# Altium footprint library common.PcbLib: 552 footprints (part 19 of 35)
Each footprint in its own frame and in the unit in brackets; x right, y up, seen from the top. Pads: shape width x height; smd on the part's side, far side on the other; paste and mask are expansions set on the pad; w line width, h text height; cw(c..) or ccw(c..) is an arc to the next point about the centre after c.
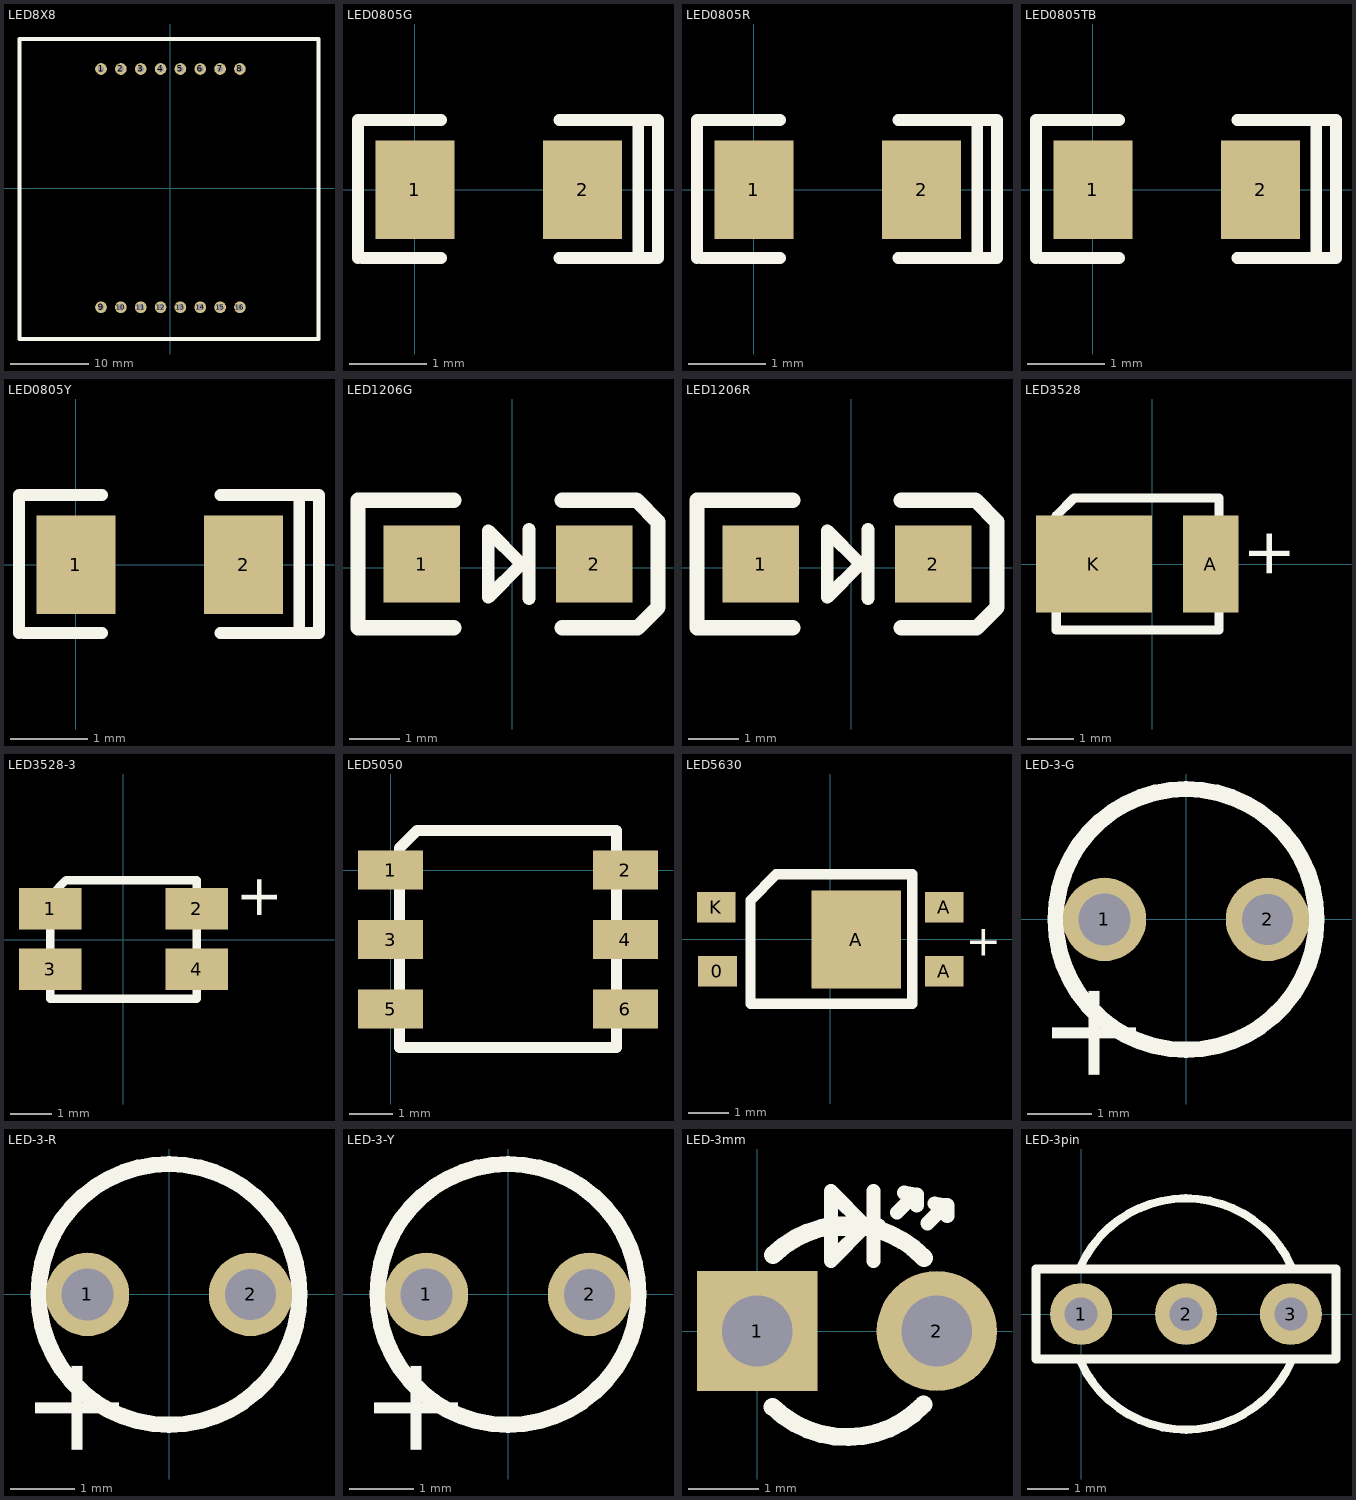
[diagram p18: the footprints below, top view; thin cyan lines are the x and y axes]

## LED8X8 [mm]
pads (16):
  round 1.5 hole 0.8: 1(-8.89,15.253) 2(-6.35,15.253) 3(-3.81,15.253) 4(-1.27,15.253) 5(1.27,15.253) 6(3.81,15.253) 7(6.35,15.253) 8(8.89,15.253) 9(-8.89,-15.253) 10(-6.35,-15.253) 11(-3.81,-15.253) 12(-1.27,-15.253) 13(1.27,-15.253) 14(3.81,-15.253) 15(6.35,-15.253) 16(8.89,-15.253)
Top Overlay:
  lines w0.508: -19.355,-19.317 -19.355,19.088 18.974,19.088 18.974,-19.317 -19.355,-19.317
3D body: height 10.4, standoff -4, extent -19.3,-19.313 19,18.987

## LED0805G [mil]
pads (2):
  rect 40x50 smd: 1(0,0) 2(85,0)
Top Overlay:
  lines w5.98: 113.15,-34.61 123.15,-34.61 ; 113.15,35.39 123.15,35.39
  lines w6: -28.86,-34.61 -28.86,35.39 13.15,35.39 ; -26.85,-34.61 13.15,-34.61 ; 73.15,-34.61 113.15,-34.61 113.15,35.39 73.15,35.39 ; 123.15,-34.61 123.15,35.39
3D body: height 43.31, standoff 0, extent 3.39,-24.21 82.91,25

## LED0805R [mil]
pads (2):
  rect 40x50 smd: 1(0,0) 2(85,0)
Top Overlay:
  lines w5.98: 113.15,-34.61 123.15,-34.61 ; 113.15,35.39 123.15,35.39
  lines w6: -28.86,-34.61 -28.86,35.39 13.15,35.39 ; -26.85,-34.61 13.15,-34.61 ; 73.15,-34.61 113.15,-34.61 113.15,35.39 73.15,35.39 ; 123.15,-34.61 123.15,35.39
3D body: height 43.31, standoff 0, extent 3.39,-24.21 82.91,25

## LED0805TB [mil]
pads (2):
  rect 40x50 smd: 1(0,0) 2(85,0)
Top Overlay:
  lines w5.98: 113.15,-34.61 123.15,-34.61 ; 113.15,35.39 123.15,35.39
  lines w6: -28.86,-34.61 -28.86,35.39 13.15,35.39 ; -26.85,-34.61 13.15,-34.61 ; 73.15,-34.61 113.15,-34.61 113.15,35.39 73.15,35.39 ; 123.15,-34.61 123.15,35.39
3D body: height 33.45, standoff 0.23, extent -2.07,-17.71 79.13,17.97

## LED0805Y [mil]
pads (2):
  rect 40x50 smd: 1(0,0) 2(85,0)
Top Overlay:
  lines w5.98: 113.15,-34.61 123.15,-34.61 ; 113.15,35.39 123.15,35.39
  lines w6: -28.86,-34.61 -28.86,35.39 13.15,35.39 ; -26.85,-34.61 13.15,-34.61 ; 73.15,-34.61 113.15,-34.61 113.15,35.39 73.15,35.39 ; 123.15,-34.61 123.15,35.39
3D body: height 43.31, standoff 0, extent 3.39,-24.21 82.92,25

## LED1206G [mil] "1/4W"
pads (2):
  rect 60x60 smd: 1(-71,3) 2(64,3)
Top Overlay:
  lines w10: 13,-24 13,30 ; -19,-23 7,3 -19,29 -19,-12 -19,-23
  lines w12: -46,-47 -121,-47 -121,53 -46,53 ; 39,-47 98,-47 114,-31 114,36 97,53 39,53
3D body: height 43.31, standoff 0, extent -65.99,-28.49 59.99,34.51

## LED1206R [mil] "1/4W"
pads (2):
  rect 60x60 smd: 1(-71,3) 2(64,3)
Top Overlay:
  lines w10: 13,-24 13,30 ; -19,-23 -19,-12 -19,29 7,3 -19,-23
  lines w12: -46,-47 -121,-47 -121,53 -46,53 ; 39,-47 98,-47 114,-31 114,36 97,53 39,53
3D body: height 43.81, standoff -15.9, extent -66,-28 60,35

## LED3528 [mm]
pads (2):
  rect 1.2x2.1 smd: A(1.257,0)
  rect 2.5x2.1 smd: K(-1.257,0)
Top Overlay:
  lines w0.2: -2.07,-1.422 1.435,-1.422 1.435,1.422 -1.689,1.422 -2.07,1.041 -2.07,-1.422
  text "+" at 2.959,-0.356 h1
3D body: height 1.8, standoff 0, extent -2.093,-1.4 1.407,1.4

## LED3528-3 [mm]
pads (4):
  rect 1.5x1 smd: 1(-1.753,0.737) 2(1.753,0.737) 3(-1.753,-0.711) 4(1.753,-0.711)
Top Overlay:
  lines w0.2: -1.753,-1.422 -1.753,1.041 -1.372,1.422 1.753,1.422 1.753,-1.422 -1.753,-1.422
  text "+" at 3.683,0.436 h1
Mechanical 2:
  text "+" at 0.508,-0.33 h1
3D body: height 1.8, standoff 0, extent -1.775,-1.4 1.725,1.4

## LED5050 [mm]
pads (6):
  rect 1.5x0.9 smd: 1(0,0) 2(5.41,0) 3(0,-1.6) 4(5.41,-1.6) 5(0,-3.2) 6(5.41,-3.2)
Top Overlay:
  lines w0.254: 0.686,0.914 5.207,0.914 5.207,-4.089 0.203,-4.089 0.203,0.508 0.61,0.914 0.991,0.914
3D body: height 1.6, standoff 0, extent 0.073,-4.075 5.373,0.925

## LED5630 [mm]
pads (5):
  rect 0.95x0.75 smd: 0(-2.769,-0.781) A(2.794,-0.781) A(2.794,0.781) K(-2.794,0.781)
  rect 2.2x2.4 smd: A(0.635,-0.006)
Top Overlay:
  lines w0.254: -1.956,-1.581 2.007,-1.581 2.007,1.594 -1.321,1.594 -1.956,0.959 -1.956,-1.581
  text "+" at 3.327,-0.4 h0.76
3D body: height 0.95, standoff -0.01, extent -2.775,-1.457 2.826,1.543

## LED-3-G [mm]
pads (2):
  round 1.3 hole 0.81: 1(-1.27,0)
  round 1.3 hole 0.8: 2(1.27,0)
Top Overlay:
  circle w0.254: c0,0 r2.032
  text "+" at -0.775,-2.642 h1.52
3D body: height 14.25, standoff -6, extent -2.021,-2.003 1.499,1.994

## LED-3-R [mm]
pads (2):
  round 1.3 hole 0.81: 1(-1.27,0)
  round 1.3 hole 0.8: 2(1.27,0)
Top Overlay:
  circle w0.254: c0,0 r2.032
  text "+" at -0.775,-2.642 h1.52
3D body: height 14.25, standoff -6, extent -2.014,-1.99 1.506,2.007

## LED-3-Y [mm]
pads (2):
  round 1.3 hole 0.81: 1(-1.27,0)
  round 1.3 hole 0.8: 2(1.27,0)
Top Overlay:
  circle w0.254: c0,0 r2.032
  text "+" at -0.775,-2.642 h1.52
3D body: height 14.25, standoff -6, extent -2.013,-2.024 1.507,1.973

## LED-3mm [mm]
pads (2):
  rect 1.7x1.7 hole 1: 1(0,0)
  round 1.7 hole 1: 2(2.54,0)
Top Overlay:
  lines w0.2: 1.646,0.991 1.646,1.981 ; 1.976,1.675 2.23,1.929 2.078,1.955 ; 2.256,1.777 2.256,1.929 ; 2.408,1.523 2.662,1.777 2.51,1.802 ; 2.688,1.625 2.688,1.777 ; 1.041,0.994 1.041,1.975 1.532,1.485 1.041,0.994
  lines w0.254: 0.22,-1.071 ccw(c1.27,0) 2.352,-1.038 ; 0.224,1.075 cw(c1.27,0) 2.356,1.035 ; 0.991,1.473 1.702,1.473
3D body: height 5.38, standoff -3.17, extent -0.722,-2.019 3.262,1.473

## LED-3pin [mm]
pads (3):
  round 1.5 hole 0.8: 1(0,0) 2(2.54,0) 3(5.08,0)
Top Overlay:
  lines w0.2: -0.015,1.145 cw(c2.54,0) 5.091,1.155 ; -0.011,-1.155 ccw(c2.54,0) 5.095,-1.145
  lines w0.22: -1.092,-1.092 -1.092,1.092 6.172,1.092 6.172,-1.092 -1.092,-1.092
3D body: height 11.61, standoff -1.83, extent -0.254,-2.946 5.486,2.946